# Altium footprint library csy.PcbLib: 198 footprints (part 1 of 13)
Each footprint in its own frame and in the unit in brackets; x right, y up, seen from the top. Pads: shape width x height; smd on the part's side, far side on the other; paste and mask are expansions set on the pad; w line width, h text height; cw(c..) or ccw(c..) is an arc to the next point about the centre after c.
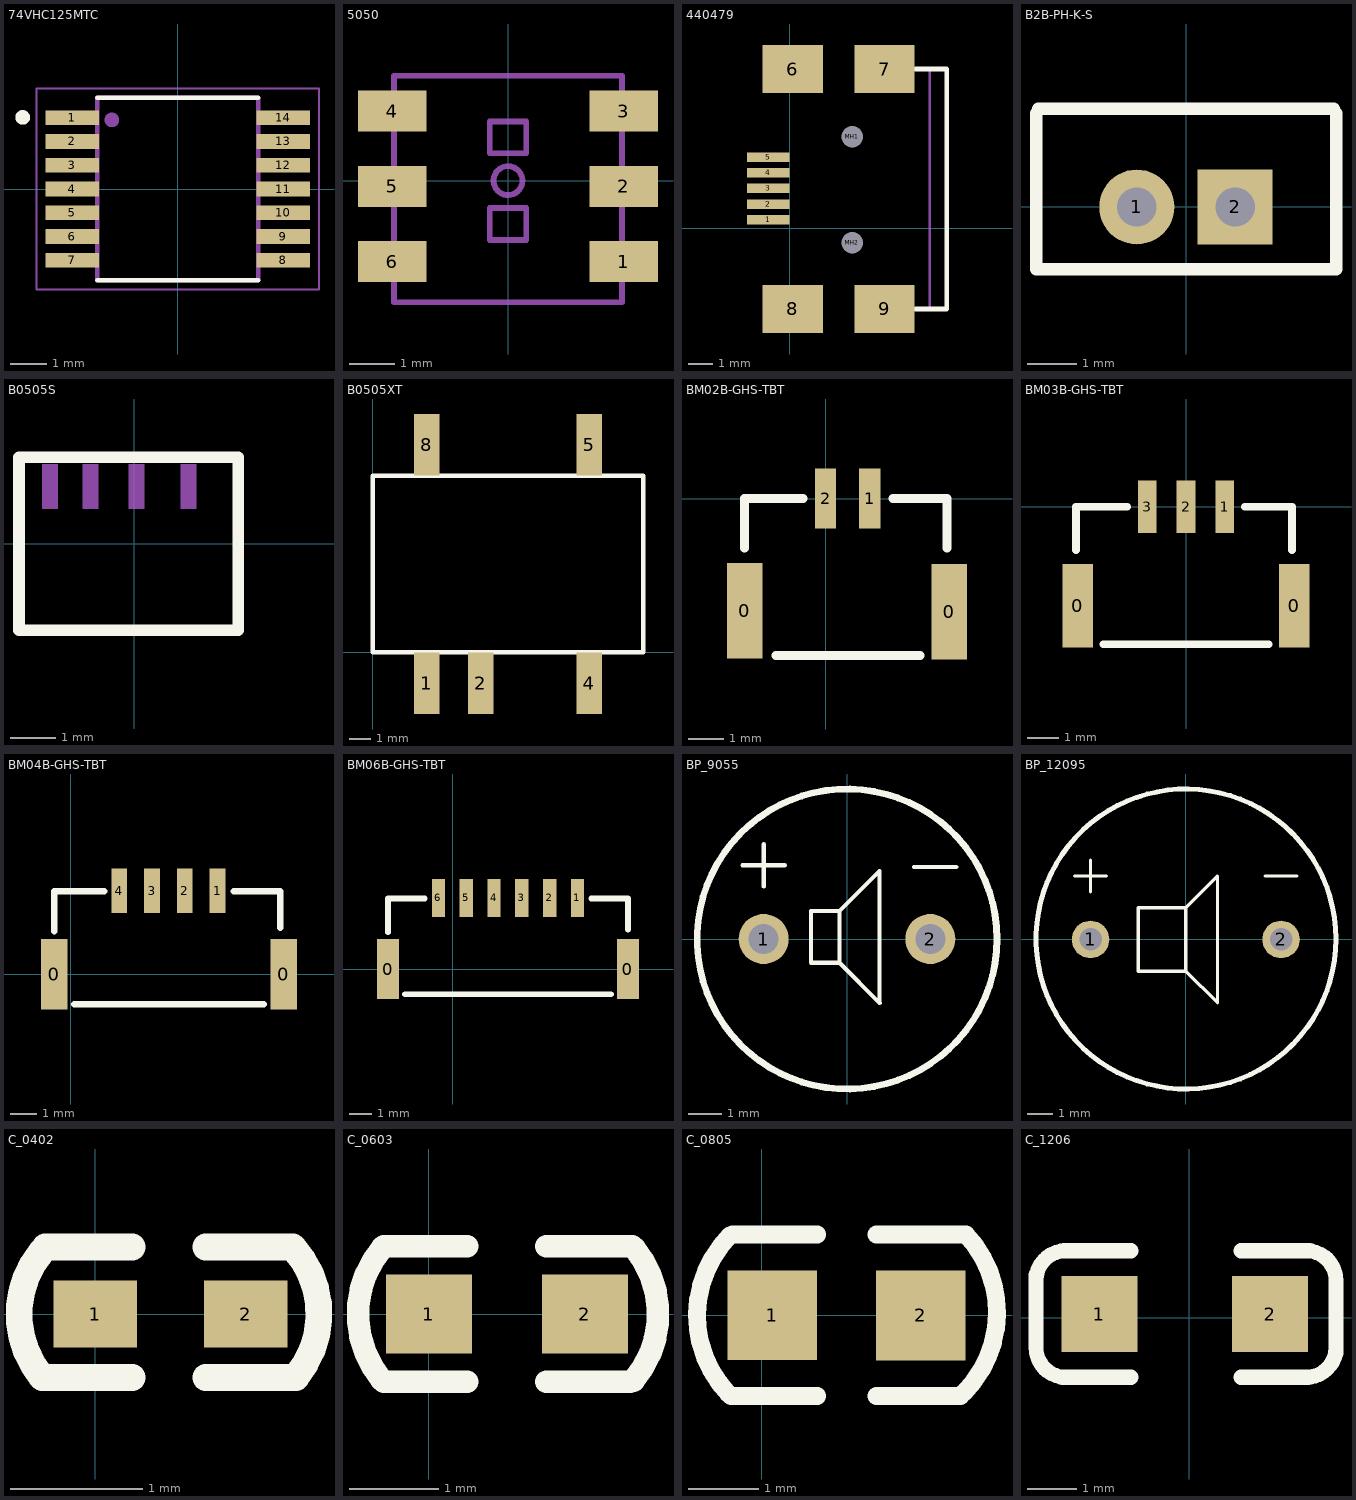
[diagram p0: the footprints below, top view; thin cyan lines are the x and y axes]

## 74VHC125MTC [mm]
pads (14):
  rect 1.46x0.41 smd: 1(-2.885,1.95) 2(-2.885,1.3) 3(-2.885,0.65) 4(-2.885,0) 5(-2.885,-0.65) 6(-2.885,-1.3) 7(-2.885,-1.95) 8(2.885,-1.95) 9(2.885,-1.3) 10(2.885,-0.65) 11(2.885,0) 12(2.885,0.65) 13(2.885,1.3) 14(2.885,1.95)
Top Overlay:
  circle w0.2: c-4.245,1.96 r0.1
  lines w0.127: -2.2,-2.5 2.2,-2.5 ; -2.2,2.5 2.2,2.5
Mechanical 4:
  circle w0.2: c-1.805,1.89 r0.1
  circle w0.2: c-1.805,1.89 r0.1
  lines w0.127: -2.2,-2.5 2.2,-2.5 ; -2.2,-2.5 -2.2,2.5 ; -2.2,-2.5 2.2,-2.5 ; -2.2,-2.5 -2.2,2.5 ; -2.2,2.5 2.2,2.5 ; -2.2,2.5 2.2,2.5 ; 2.2,-2.5 2.2,2.5 ; 2.2,-2.5 2.2,2.5
Mechanical 16:
  lines w0.05: -3.865,-2.75 3.865,-2.75 3.865,2.75 -3.865,2.75 -3.865,-2.75

## 5050 [mm]
pads (6):
  rect 1.5x0.9 smd: 1(2.54,-1.778) 2(2.54,-0.127) 3(2.54,1.524) 4(-2.54,1.524) 5(-2.54,-0.127) 6(-2.54,-1.778)
Mechanical 4:
  circle w0.127: c0,0 r0.316
  circle w0.127: c0,0 r0.316
  lines w0.127: -2.5,-2.3 -2.5,2.3 ; 2.5,-2.3 2.5,2.3 ; -2.5,2.3 2.5,2.3 ; -2.5,2.3 -2.5,-2.667 2.5,-2.667 2.5,2.3 ; -2.5,2.3 2.5,2.3 ; -0.4,-1.3 -0.4,-0.6 ; -0.4,-1.3 0.4,-1.3 ; -0.4,-1.3 -0.4,-0.6 ; -0.4,-1.3 0.4,-1.3 ; -0.4,-0.6 0.4,-0.6 ; -0.4,-0.6 0.4,-0.6 ; -0.4,0.6 0.4,0.6 ; -0.4,0.6 -0.4,1.3 ; -0.4,0.6 0.4,0.6 ; -0.4,0.6 -0.4,1.3 ; -0.4,1.3 0.4,1.3 ; -0.4,1.3 0.4,1.3 ; 0.4,-1.3 0.4,-0.6 ; 0.4,-1.3 0.4,-0.6 ; 0.4,0.6 0.4,1.3 ; 0.4,0.6 0.4,1.3

## 440479 [mm] "Connector; USB2.0, Type AB, SM; 5 Position; Right Angle"
height 3.9
pads (11):
  rect 1.75x0.4 smd: 1(-0.889,0.351) 2(-0.889,1.001) 3(-0.889,1.651) 4(-0.889,2.301) 5(-0.889,2.951)
  rect 2.5x2 smd: 6(0.127,6.604) 7(3.937,6.604) 8(0.127,-3.35) 9(3.937,-3.35)
  round 0.6 hole 0.9 unplated: MH1(2.6,3.8) MH2(2.6,-0.6)
Top Overlay:
  lines w0.2: 5.207,6.604 6.507,6.604 ; 5.218,-3.35 6.518,-3.35 6.518,6.55
Mechanical 1:
  lines w0.1: 5.818,-3.35 5.818,6.55
  text "PCB Edge" at 6.25,-2.436 h0.25

## B2B-PH-K-S [mm]
pads (2):
  round 1.524 hole 0.8: 1(-1,0)
  rect 1.524x1.524 hole 0.8: 2(1,0)
Top Overlay:
  lines w0.254: -3.048,1.905 -3.048,-1.27 3.048,-1.27 3.048,1.905 ; -3,2 3,2

## B0505S [mm] "B0505S"
Top Overlay:
  lines w0.254: -2.54,-1.905 -2.54,1.905 2.286,1.905 2.286,-1.905 -2.54,-1.905
Mechanical 1:
  rectangle: -2.032,0.762 -1.682,1.762
  rectangle: -1.143,0.762 -0.793,1.762
  rectangle: -0.127,0.762 0.223,1.762
  rectangle: 1.016,0.762 1.366,1.762
  region: 4.064,-2.794
Drill Drawing:
  rectangle: -1.95,-1.5 1.95,1.5

## B0505XT [mm]
pads (5):
  rect 1.2x2.9 smd: 1(2.54,-1.45) 2(5.08,-1.45) 4(10.16,-1.45) 5(10.16,9.75) 8(2.54,9.75)
Top Overlay:
  lines w0.203: 0,0 12.7,0 12.7,8.3 0,8.3 0,0
3D body "B0505XT_1.STEP": height 7.3, standoff 0.05, extent -0.127,-1.282 12.573,9.918

## BM02B-GHS-TBT [mm]
pads (4):
  rect 1x2.7 smd: 0(-2.286,-3.175) 0(3.5,-3.2)
  rect 0.6x1.7 smd: 1(1.25,0) 2(0,0)
Top Overlay:
  lines w0.254: -2.286,-1.397 -2.286,0 -0.635,0 ; -1.397,-4.445 2.667,-4.445 ; 1.905,0 3.429,0 3.429,-1.397

## BM03B-GHS-TBT [mm]
pads (5):
  rect 1x2.7 smd: 0(-3.5,-3.2) 0(3.5,-3.2)
  rect 0.6x1.7 smd: 1(1.25,0) 2(0,0) 3(-1.25,0)
Top Overlay:
  lines w0.254: -3.556,-1.397 -3.556,0 -1.905,0 ; -2.667,-4.445 2.667,-4.445 ; 1.905,0 3.429,0 3.429,-1.397

## BM04B-GHS-TBT [mm]
height 1.45
pads (6):
  rect 1x2.7 smd: 0(-0.635,0) 0(8.128,0)
  rect 0.6x1.7 smd: 1(5.6,3.2) 2(4.35,3.2) 3(3.1,3.2) 4(1.85,3.2)
Top Overlay:
  lines w0.254: -0.635,1.651 -0.635,3.175 1.27,3.175 ; 0.127,-1.143 7.366,-1.143 ; 6.223,3.175 8.001,3.175 8.001,1.778

## BM06B-GHS-TBT [mm]
height 1.45
pads (8):
  rect 1x2.7 smd: 0(-2.921,0) 0(7.874,0)
  rect 0.6x1.7 smd: 1(5.6,3.2) 2(4.35,3.2) 3(3.1,3.2) 4(1.85,3.2) 5(0.6,3.2) 6(-0.65,3.2)
Top Overlay:
  lines w0.254: -2.921,1.651 -2.921,3.175 -1.27,3.175 ; -2.159,-1.143 7.112,-1.143 ; 6.223,3.175 7.874,3.175 7.874,1.778

## BP_9055 [mm]
pads (2):
  round 1.5 hole 0.9: 1(-2.5,0) 2(2.5,0)
Top Overlay:
  circle w0.2: c0,0 r4.5
  lines w0.127: -3.135,2.21 -1.865,2.21 ; -2.5,1.575 -2.5,2.845 ; -0.229,-0.65 -0.229,0.838 ; 2.007,2.159 3.277,2.159 ; -0.229,0.838 0.976,2.043 0.976,-1.92 0.98,-1.92 -0.229,-0.711 -1.081,-0.711 -1.081,0.838 -0.229,0.838
3D body "BUZZER.STEP": height 6, standoff -5.5, extent -4.504,-4.504 4.496,4.496

## BP_12095 [mm]
pads (2):
  round 1.5 hole 0.9: 1(-3.81,0) 2(3.81,0)
Top Overlay:
  circle w0.2: c0.008,0.018 r6
  lines w0.127: -4.445,2.54 -3.175,2.54 ; -3.81,1.905 -3.81,3.175 ; 3.175,2.54 4.445,2.54 ; 0,-1.27 -1.905,-1.27 -1.905,1.27 0,1.27 ; 0,-1.27 1.27,-2.54 1.27,2.54 0,1.27 ; 0,-1.27 0,1.27

## C_0402 [mil] "1005"
pads (2):
  rect 25x20 smd: 1(0,0) 2(45,0)
Top Overlay:
  lines w8: -15.94,-19 11,-19 ; -15.94,-18.95 cw(c6.42,-0.05) -15.95,18.84 ; -15,20 11,20 ; 33,-19 59.95,-19 ; 33,20 59,20 cw(c37.58,0.05) 59.95,-18.84
3D body "cap_0402.STEP": height 19.68, standoff 0, extent 2.31,-10 41.69,9.69

## C_0603 [mil] "1608"
pads (2):
  rect 38x35 smd: 1(0,0) 2(69,0)
Top Overlay:
  lines w10: -21,-29 cw(c14.45,-0.04) -20.48,29.56 ; -20,-30 17,-30 ; -20,30 17,30 ; 52,-30 89,-30 ; 52,30 90,30 ; 90.48,-29.56 ccw(c55.55,0.04) 91,29
3D body "User Library-0603 SMD Capacitor.STEP": height 11.89, standoff 0, extent 3.8,-15.8 66.8,15.7

## C_0805 [mil] "2012"
pads (2):
  rect 50x50 smd: 1(6,0) 2(88.7,-0.1)
Top Overlay:
  lines w10: -18.66,-43.67 cw(c27.24,-0.08) -17.7,44.5 ; -17.2,-45 31,-45 ; -16.3,45 31,45 ; 64,-45 111,-45 ; 64,45 113.1,45 ; 112.92,-43.04 ccw(c67.98,1.54) 114,45
3D body "User Library-0805 SMD Capacitor.STEP": height 30.39, standoff -0.39, extent 7.93,-24.5 86.67,24.71

## C_1206 [mil] "3216"
pads (2):
  rect 60x60 smd: 1(-71,3) 2(64,3)
Top Overlay:
  lines w11.81: -121,-23 ccw(c-97.5,-23.5) -98,-47 ; -121,30 cw(c-97.5,29.5) -97,53 ; 92,-47 ccw(c92.5,-23.5) 116,-24 ; 93,53 cw(c92.5,29.5) 116,29
  lines w12: -121,-24 -121,34 ; -100,-47 -46,-47 ; -99,53 -46,53 ; 41,-47 94,-47 ; 41,53 95,53 ; 116,-28 116,30
3D body "Capacitor 1206 SMD1.step": height 39.45, standoff 0, extent -66.99,-28.49 58.99,34.5